# Altium footprint library CryptLib.PcbLib: 52 footprints (part 3 of 4)
Each footprint in its own frame and in the unit in brackets; x right, y up, seen from the top. Pads: shape width x height; smd on the part's side, far side on the other; paste and mask are expansions set on the pad; w line width, h text height; cw(c..) or ccw(c..) is an arc to the next point about the centre after c.
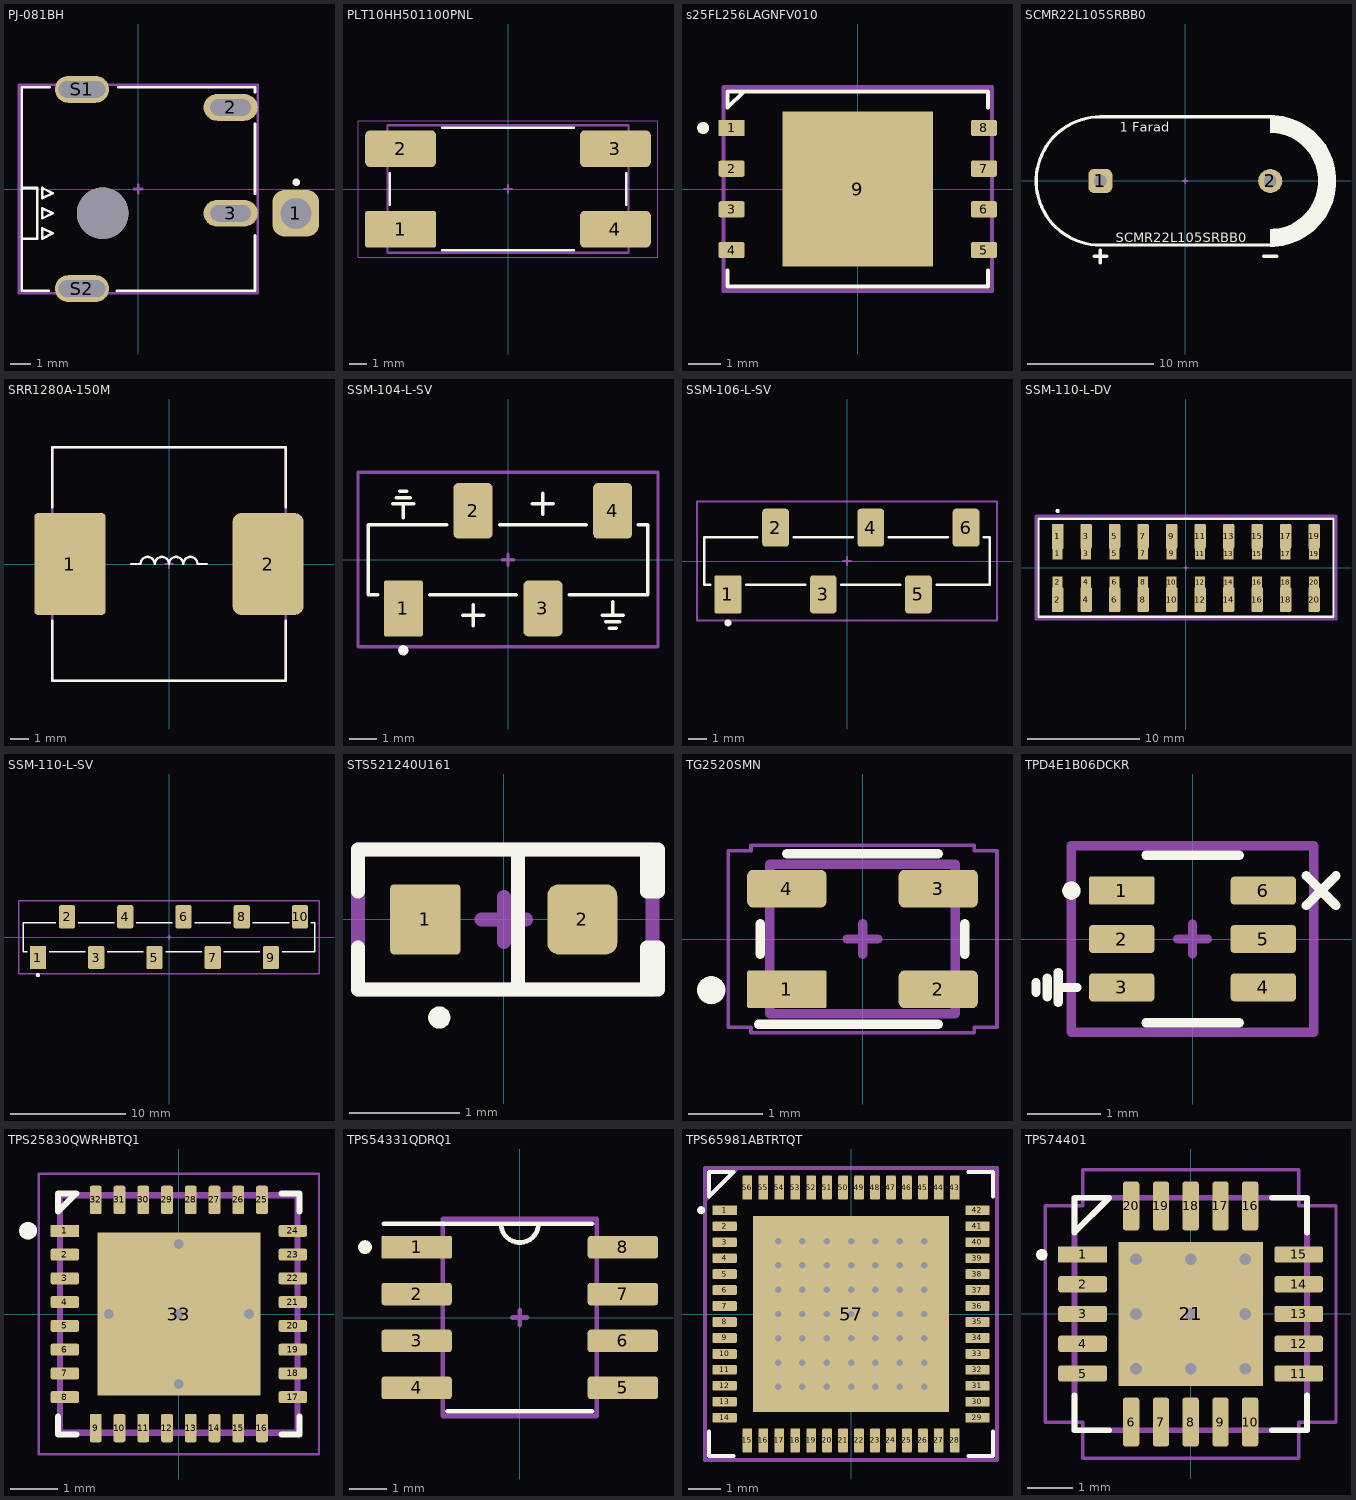
[diagram p2: the footprints below, top view; thin cyan lines are the x and y axes]

## PJ-081BH [mil]
pads (8):
  rrect50% 90x90 hole 60: 1(305,-47)
  oval 105x52 hole 32 slot 78.74 at 0 deg: 2(179,158) 3(179,-47)
  oval 105x52 hole 32 slot 90.55 at 0 deg: S1(-109,193) S2(-109,-193)
  round 100 hole 100 unplated: ""(-69,-47)
  round 7.5 on Mech8: ""(305,-47)
  round 15 on Top Overlay: ""(306,13)
Top Overlay:
  lines w5: -226,-96 -196,-96 -196,2 -226,2 ; -173,-197 -226,-197 -226,197 -172,197 ; -42,-197 226,-197 226,-90 ; -39,197 226,197 226,187 ; 226,-9 226,126 ; -186,-96 -166,-86 -186,-76 -186,-96 ; -186,-57 -166,-47 -186,-37 -186,-57 ; -186,-18 -166,-8 -186,2 -186,-18
Top Designator:
  text "'.Designator'" at -113.3,-8.33 h20
Top Assembly:
  lines w5: -8,0 8,0 ; 0,-8 0,8 ; -231,-202 -231,202 231,202 231,-202 -231,-202
3D body "CUI_DEVICES_PJ-081BH.step": height 288.96, standoff -92.93, extent -225.18,-196.85 326,196.85

## PLT10HH501100PNL [mil]
pads (5):
  rrect10% 156x80 smd: 1(-236.22,-88.58)
  rrect25% 156x80 smd: 2(-236.22,88.58) 3(236.22,88.58) 4(236.22,-88.58)
  round 7.5 on Mech8: ""(-236.22,-88.58)
Top Overlay:
  lines w5: -260,-35 -260,35 ; -145,-135 145,-135 ; -145,135 145,135 ; 260,-35 260,35
Top Designator:
  text "'.Designator'" at -113.3,-8.33 h20
Top Assembly:
  lines w5: -8,0 8,0 ; 0,-8 0,8 ; -265,-140 -265,140 265,140 265,-140 -265,-140
Top Courtyard (Mech10):
  lines w2: -330,-150 -330,150 330,150 330,-150 -330,-150
3D body "step_temp.STEP": height 370.08, standoff 0, extent -263.78,-129.92 263.78,129.92

## s25FL256LAGNFV010 [mil]
pads (11):
  rrect10% 32x20 smd: 1(-155,75)
  rrect25% 32x20 smd: 2(-155,25) 3(-155,-25) 4(-155,-75) 5(155,-75) 6(155,-25) 7(155,25) 8(155,75)
  rect 185x190 smd: 9(0,0)
  round 15 on Top Overlay: ""(-190,75)
  round 7.5 on Mech8: ""(-155,75)
Top Overlay:
  lines w5: -160,-100 -160,-120 160,-120 160,-100 ; -140,120 -160,100 -160,120 160,120 160,100
Top Designator:
  text "'.Designator'" at -113.3,-8.33 h20
Top Assembly:
  lines w5: -8,0 8,0 ; 0,-8 0,8 ; -165,-125 -165,125 165,125 165,-125 -165,-125
3D body "W25Q256JVEIQ TR--3DModel-STEP-1.STEP": height 32, standoff 0.5, extent -157.48,-118.12 157.48,118.1

## SCMR22L105SRBB0 [mil]
pads (3):
  rrect50% 75x75 hole 40: 1(-265,0)
  round 75 hole 40: 2(265,0)
  round 7.5 on Mech8: ""(-265,0)
Top Overlay:
  region: 265,205 265,150 274.81,149.68 294.26,147.12 313.22,142.04 331.34,134.53 348.34,124.72 363.9,112.78 377.78,98.9 389.72,83.34 399.53,66.34 407.04,48.22 412.12,29.26 414.68,9.81 415,0 414.68,-9.81 412.12,-29.26 407.04,-48.22 399.53,-66.34 389.72,-83.33 377.78,-98.9 363.9,-112.78 348.34,-124.72 331.34,-134.53 313.22,-142.04 294.26,-147.12 274.81,-149.68 265,-150 265,-205 278.44,-205.02 305.1,-201.54 331.07,-194.6 355.91,-184.33 379.2,-170.9 400.53,-154.54 419.54,-135.53 435.9,-114.2 449.33,-90.91 459.6,-66.07 466.54,-40.1 470.02,-13.44 470,0 469.98,13.43 466.45,40.06 459.47,66 449.18,90.82 435.74,114.08 419.38,135.38 400.38,154.38 379.07,170.74 355.82,184.18 331,194.47 305.06,201.45 278.43,204.98
  lines w10: -285,-235 -245,-235 ; -265.5,-200 265.5,-200 ; -265.5,200 265.5,200 ; -265,-255 -265,-215 ; -265,-200 cw(c-265,0) -265,200 ; 245,-235 285,-235 ; 265,-200 ccw(c265,0) 265,200
  text "SCMR22L105SRBB0" at -217.43,-191 h30
  text "1 Farad" at -204.44,154 h30
Top Designator:
  text "'.Designator'" at -113.3,-8.33 h20
Top Assembly:
  lines w5: -265.5,-200 cw(c-265.5,0) -265.5,200 ; -265,-200 265,-200 ; -265,200 265,200 ; -8,0 8,0 ; 0,-8 0,8 ; 265.5,-200 ccw(c265.5,0) 265.5,200
3D body "SUPERCAP.STEP": height 871.64, standoff -742.53, extent -423.23,-157 423.23,157.96

## SRR1280A-150M [mil]
pads (3):
  rrect10% 150x215 smd: 1(-209,0)
  rrect25% 150x215 smd: 2(209,0)
  round 7.5 on Mech8: ""(-209,0)
Top Overlay:
  lines w5: -246,-120 -246,-246 246,-246 246,-120 ; -246,120 -246,246 246,246 246,120 ; -80,0 -60,0 cw(c-45,0) -30,0 cw(c-15,0) 0,0 cw(c15,0) 30,0 cw(c45,0) 60,0 80,0
Top Designator:
  text "'.Designator'" at -113.3,-8.33 h20
Top Assembly:
  lines w5: -8,0 8,0 ; 0,-8 0,8 ; -246,-246 -246,246 246,246 246,-246 -246,-246
3D body "SRR1280A.stp": height 308.07, standoff 0, extent -246.06,-246.06 246.07,246.07

## SSM-104-L-SV [mil]
pads (6):
  rrect10% 56x80 smd: 1(-150,-70)
  rrect25% 56x80 smd: 2(-50,70) 3(50,-70) 4(150,70)
  round 15 on Top Overlay: ""(-150,-130)
  round 7.5 on Mech8: ""(-150,-70)
Top Overlay:
  lines w5: -187,-50 -200,-50 -200,50 -88,50 ; -165,80 -135,80 ; -160,89 -140,89 ; -155,98 -145,98 ; -150,60 -150,80 ; -112,-50 12,-50 ; -65,-80 -35,-80 ; -50,-95 -50,-65 ; -12,50 112,50 ; 35,80 65,80 ; 50,65 50,95 ; 88,-50 200,-50 200,50 187,50 ; 135,-80 165,-80 ; 140,-89 160,-89 ; 145,-98 155,-98 ; 150,-80 150,-60
Top Designator:
  text "'.Designator'" at -113.3,-8.33 h20
Top Assembly:
  lines w5: -8,0 8,0 ; 0,-8 0,8 ; -215,-125 -215,125 215,125 215,-125 -215,-125
3D body "SSM-104-L-SV.stp": height 295.5, standoff 0.5, extent -200,-90 200,90

## SSM-106-L-SV [mil]
pads (8):
  rrect10% 56x80 smd: 1(-250,-70)
  rrect25% 56x80 smd: 2(-150,70) 3(-50,-70) 4(50,70) 5(150,-70) 6(250,70)
  round 15 on Top Overlay: ""(-250,-130)
  round 7.5 on Mech8: ""(-250,-70)
Top Overlay:
  lines w5: -287,-50 -300,-50 -300,50 -188,50 ; -212,-50 -88,-50 ; -112,50 12,50 ; -12,-50 112,-50 ; 88,50 212,50 ; 188,-50 300,-50 300,50 287,50
Top Designator:
  text "'.Designator'" at -113.3,-8.33 h20
Top Assembly:
  lines w5: -8,0 8,0 ; 0,-8 0,8 ; -315,-125 315,-125 315,125 -315,125 -315,-125
3D body "SSM-106-L-SV.stp": height 295.5, standoff 0.5, extent -300,-90 300,90

## SSM-110-L-DV [mil]
pads (42):
  rect 35x40 smd: 1(-450,50) 2(-450,-50) 3(-350,50) 4(-350,-50) 5(-250,50) 6(-250,-50) 7(-150,50) 8(-150,-50) 9(-50,50) 10(-50,-50) 11(50,50) 12(50,-50) 13(150,50) 14(150,-50) 15(250,50) 16(250,-50) 17(350,50) 18(350,-50) 19(450,50) 20(450,-50)
  rrect10% 40x88 smd: 1(-450,111)
  rrect25% 40x88 smd: 2(-450,-111) 3(-350,111) 4(-350,-111) 5(-250,111) 6(-250,-111) 7(-150,111) 8(-150,-111) 9(-50,111) 10(-50,-111) 11(50,111) 12(50,-111) 13(150,111) 14(150,-111) 15(250,111) 16(250,-111) 17(350,111) 18(350,-111) 19(450,111) 20(450,-111)
  round 7.5 on Mech8: ""(-450,111)
  round 15 on Top Overlay: ""(-450,200)
Top Overlay:
  lines w7.87: -517,-171 -517,173 518,173 518,-171 -517,-171
Top Designator:
  text "'.Designator'" at -113.3,-8.33 h20
Top Assembly:
  lines w5: -8,0 8,0 ; 0,-8 0,8
  lines w10: -525.81,-179.81 -525.81,182 527,182 527,-179.81 -525.81,-179.81
3D body "SSM-110-L-DV.stp": height 292.5, standoff 0.5, extent -500.01,-138.5 499.99,138.5

## SSM-110-L-SV [mil]
pads (12):
  rrect10% 56x80 smd: 1(-450,-70)
  rrect25% 56x80 smd: 2(-350,70) 3(-250,-70) 4(-150,70) 5(-50,-70) 6(50,70) 7(150,-70) 8(250,70) 9(350,-70) 10(450,70)
  round 15 on Top Overlay: ""(-450,-130)
  round 7.5 on Mech8: ""(-450,-70)
Top Overlay:
  lines w5: -487,-50 -500,-50 -500,50 -388,50 ; -412,-50 -288,-50 ; -312,50 -188,50 ; -212,-50 -88,-50 ; -112,50 12,50 ; -12,-50 112,-50 ; 88,50 212,50 ; 188,-50 312,-50 ; 288,50 412,50 ; 388,-50 500,-50 500,50 487,50
Top Designator:
  text "'.Designator'" at -113.3,-8.33 h20
Top Assembly:
  lines w5: -8,0 8,0 ; 0,-8 0,8 ; -515,-125 -515,125 515,125 515,-125 -515,-125
3D body "SSM-110-L-SV.stp": height 295.5, standoff 0.5, extent -500.01,-90 499.99,90

## STS521240U161 [mil]
pads (4):
  rrect10% 25x25 smd: 1(-28,0)
  rrect33% 25x25 smd: 2(28,0)
  round 7.5 on Mech8: ""(-28,0)
  round 8 on Top Overlay: ""(-23,-35)
Top Overlay:
  lines w5: -52,-10 -52,-25 55,-25 55,-10 51,-10 51,-25 ; -52,10 -52,25 55,25 55,10 51,10 51,25 ; 5,-25 5,25
Top Designator:
  text "'.Designator'" at -113.3,-8.33 h20
Top Assembly:
  lines w5: -8,0 8,0 ; 0,-8 0,8 ; -52,-25 53,-25 53,25 -52,25 -52,-25
3D body "User Library-SOD523-2.step": height 26.13, standoff 0.5, extent -32.48,-15.75 32.48,15.73

## TG2520SMN [mil] "4-SMD 2.5x2.0"
height 32
pads (6):
  rrect10% 42x20 smd: 1(-40,-26.57)
  rrect33% 42x20 smd: 2(40,-26.57) 3(40,26.57) 4(-40,26.57)
  round 15 on Top Overlay: ""(-80,-27)
  round 7.5 on Mech8: ""(-40,-26.57)
Top Overlay:
  lines w5: -55,-45 40,-45 ; -54,-8 -54,8 ; -40,45 40,45 ; 54,-8 54,8
Top Designator:
  text "'.Designator'" at -113.3,-8.33 h20
Top Assembly:
  lines w5: -8,0 8,0 ; 0,-8 0,8 ; -49,-39.5 -49,39.5 49,39.5 49,-39.5 -49,-39.5
Top Courtyard (Mech10):
  lines w2: -71,-46.57 -59,-46.57 -59,-49.5 59,-49.5 59,-46.57 71,-46.57 71,46.57 59,46.57 59,49.5 -59,49.5 -59,46.57 -71,46.57 -71,-46.57
3D body "TG2520SMN.stp": height 32.39, standoff 0.5, extent -51.32,-42.39 51.05,40.29

## TPD4E1B06DCKR [mil]
pads (8):
  rrect10% 35x15 smd: 1(-38,26)
  rrect25% 35x15 smd: 2(-38,0) 3(-38,-26) 4(38,-26) 5(38,0) 6(38,26)
  round 10 on Top Overlay: ""(-65,26)
  round 7.5 on Mech8: ""(-38,26)
Top Overlay:
  lines w5: -84,-28.5 -84,-23.5 ; -78,-31 -78,-21 ; -72,-34 -72,-18 ; -72,-26 -62,-26 ; -25,-45 25,-45 ; -25,45 25,45 ; 61,18 77,34 ; 61,34 77,18
Top Designator:
  text "'.Designator'" at -113.3,-8.33 h20
Top Assembly:
  lines w5: -8,0 8,0 ; 0,-8 0,8
Mechanical 15:
  lines w5: -65,-50 -65,50 65,50 65,-50 -65,-50
3D body "TPD4E1B06DCKR.STEP": height 43.81, standoff 0.5, extent -41.34,-39.38 41.34,39.36

## TPS25830QWRHBTQ1 [mm]
pads (40):
  rrect10% 0.6x0.25 smd mask+0: 1(-2.4,1.75)
  rrect33% 0.6x0.25 smd mask+0: 2(-2.4,1.25) 3(-2.4,0.75) 4(-2.4,0.25) 5(-2.4,-0.25) 6(-2.4,-0.75) 7(-2.4,-1.25) 8(-2.4,-1.75) 17(2.4,-1.75) 18(2.4,-1.25) 19(2.4,-0.75) 20(2.4,-0.25) 21(2.4,0.25) 22(2.4,0.75) 23(2.4,1.25) 24(2.4,1.75)
  rrect33% 0.25x0.6 smd mask+0: 9(-1.75,-2.4) 10(-1.25,-2.4) 11(-0.75,-2.4) 12(-0.25,-2.4) 13(0.25,-2.4) 14(0.75,-2.4) 15(1.25,-2.4) 16(1.75,-2.4) 25(1.75,2.4) 26(1.25,2.4) 27(0.75,2.4) 28(0.25,2.4) 29(-0.25,2.4) 30(-0.75,2.4) 31(-1.25,2.4) 32(-1.75,2.4)
  rect 3.429x3.429 smd paste-253.975 mask+0: 33(0,0)
  round 0.381 on Top Overlay: ""(-3.175,1.753)
  round 0.191 on Mech8: ""(-2.4,1.75)
  round 0.406 hole 0.203 mask+0: ""(-1.475,0) ""(0,-1.475) ""(0,0) ""(0,1.475) ""(1.475,0)
Top Overlay:
  lines w0.127: -2.54,-2.159 -2.54,-2.54 -2.159,-2.54 ; 2.159,-2.54 2.54,-2.54 2.54,-2.159 ; 2.159,2.54 2.54,2.54 2.54,2.159 ; -2.54,2.159 -2.54,2.54 -2.159,2.54 -2.54,2.159
Top Paste:
  region: -0.1,0.1 -1.59,0.1 -1.59,1.59 -0.1,1.59
  region: 1.59,0.1 0.1,0.1 0.1,1.59 1.59,1.59
  region: -0.1,-1.59 -1.59,-1.59 -1.59,-0.1 -0.1,-0.1
  region: 1.59,-1.59 0.1,-1.59 0.1,-0.1 1.59,-0.1
Top Solder:
  drawing of 33 lines, arcs and shapes, not listed
Top Designator:
  text "'.Designator'" at -2.878,-0.212 h0.51
Top Assembly:
  lines w0.127: -2.5,2.199 -2.199,2.5 ; -0.203,0 0.203,0 ; 0,-0.203 0,0.203 ; -2.5,-2.5 2.5,-2.5 2.5,2.5 -2.5,2.5 -2.5,-2.5
Top Courtyard (Mech10):
  lines w0.051: -2.95,-2.95 2.95,-2.95 2.95,2.95 -2.95,2.95 -2.95,-2.95
3D body "TPS25830QWRHBTQ1.STEP": height 1.01, standoff 0.01, extent -2.5,-2.5 2.5,2.5

## TPS54331QDRQ1 [mil]
pads (10):
  rrect10% 75x24 smd: 1(-110,75)
  rrect25% 75x24 smd: 2(-110,25) 3(-110,-25) 4(-110,-75) 5(110,-75) 6(110,-25) 7(110,25) 8(110,75)
  round 15 on Top Overlay: ""(-165,75)
  round 7.5 on Mech8: ""(-110,75)
Top Overlay:
  lines w5: -145,100 77,100 ; -77,-100 77,-100 ; -20,100 ccw(c0,100) 20,100
Top Designator:
  text "'.Designator'" at -113.3,-8.33 h20
Top Assembly:
  lines w5: -8,0 8,0 ; 0,-8 0,8 ; -82,-105 82,-105 82,105 -82,105 -82,-105
3D body "TPS54331QDRQ1.STEP": height 69.4, standoff 0.5, extent -118.11,-96.46 118.11,96.45

## TPS65981ABTRTQT [mil]
pads (108):
  rrect10% 30x12 smd: 1(-155.94,127.95)
  rrect25% 30x12 smd: 2(-155.94,108.27) 3(-155.94,88.58) 4(-155.94,68.9) 5(-155.94,49.21) 6(-155.94,29.53) 7(-155.94,9.84) 8(-155.94,-9.84) 9(-155.94,-29.53) 10(-155.94,-49.21) 11(-155.94,-68.9) 12(-155.94,-88.58) 13(-155.94,-108.27) 14(-155.94,-127.95) 29(155.94,-127.95) 30(155.94,-108.27) 31(155.94,-88.58) 32(155.94,-68.9) 33(155.94,-49.21) 34(155.94,-29.53) 35(155.94,-9.84) 36(155.94,9.84) 37(155.94,29.53) 38(155.94,49.21) 39(155.94,68.9) 40(155.94,88.58) 41(155.94,108.27) 42(155.94,127.95)
  rrect25% 12x30 smd: 15(-127.98,-155.94) 16(-108.3,-155.94) 17(-88.61,-155.94) 18(-68.92,-155.94) 19(-49.23,-155.94) 20(-29.54,-155.94) 21(-9.85,-155.94) 22(9.85,-155.94) 23(29.54,-155.94) 24(49.23,-155.94) 25(68.92,-155.94) 26(88.61,-155.94) 27(108.3,-155.94) 28(127.98,-155.94) 43(127.98,155.94) 44(108.3,155.94) 45(88.61,155.94) 46(68.92,155.94) 47(49.23,155.94) 48(29.54,155.94) 49(9.85,155.94) 50(-9.85,155.94) 51(-29.54,155.94) 52(-49.23,155.94) 53(-68.92,155.94) 54(-88.61,155.94) 55(-108.3,155.94) 56(-127.98,155.94)
  rect 242x242 smd: 57(0,0)
  round 10 on Top Overlay: ""(-185,128)
  round 7.5 on Mech8: ""(-155.94,127.95)
  round 16 hole 8 mask+0: ""(-90,-90) ""(-90,-60) ""(-90,-30) ""(-90,0) ""(-90,30) ""(-90,60) ""(-90,90) ""(-60,-90) ""(-60,-60) ""(-60,-30) ""(-60,0) ""(-60,30) ""(-60,60) ""(-60,90) ""(-30,-90) ""(-30,-60) ""(-30,-30) ""(-30,0) ""(-30,30) ""(-30,60) ""(-30,90) ""(0,-90) ""(0,-60) ""(0,-30) ""(0,0) ""(0,30) ""(0,60) ""(0,90) ""(30,-90) ""(30,-60) ""(30,-30) ""(30,0) ""(30,30) ""(30,60) ""(30,90) ""(60,-90) ""(60,-60) ""(60,-30) ""(60,0) ""(60,30) ""(60,60) ""(60,90) ""(90,-90) ""(90,-60) ""(90,-30) ""(90,0) ""(90,30) ""(90,60) ""(90,90)
Top Overlay:
  lines w5: -175,-145 -175,-175 -145,-175 ; 145,-175 175,-175 175,-145 ; 145,175 175,175 175,145 ; -175,145 -175,175 -145,175 -175,145
Top Designator:
  text "'.Designator'" at -113.3,-8.33 h20
Top Assembly:
  lines w5: -180,140 -140,180 ; -8,0 8,0 ; 0,-8 0,8 ; -180,-180 -180,180 180,180 180,-180 -180,-180
3D body "RTQ0056H.stp": height 39.37, standoff 0, extent -157.48,-157.48 157.49,157.49

## TPS74401 [mil] "LDO Regulator"
height 40
pads (23):
  rrect10% 42x14 smd: 1(-92.91,51.18)
  rrect33% 42x14 smd: 2(-92.91,25.59) 3(-92.91,0) 4(-92.91,-25.59) 5(-92.91,-51.18) 11(92.91,-51.18) 12(92.91,-25.59) 13(92.91,0) 14(92.91,25.59) 15(92.91,51.18)
  rrect33% 14x42 smd: 6(-51.18,-92.91) 7(-25.59,-92.91) 8(0,-92.91) 9(25.59,-92.91) 10(51.18,-92.91) 16(51.18,92.91) 17(25.59,92.91) 18(0,92.91) 19(-25.59,92.91) 20(-51.18,92.91)
  rect 124.02x124.02 smd paste-118.11: 21(0,0)
  round 10 on Top Overlay: ""(-128,51)
  round 7.5 on Mech8: ""(-92.91,51.18)
via 47.05,-47.05 diameter 20 hole 10
via 47.05,47.05 diameter 20 hole 10
via -47.05,47.05 diameter 20 hole 10
via -47.05,-47.05 diameter 20 hole 10
via 0,-47 diameter 20 hole 10
via 0,47 diameter 20 hole 10
via 47,0 diameter 20 hole 10
via -47,0 diameter 20 hole 10
via 0,0 diameter 20 hole 10
Top Overlay:
  lines w5: -100,-70 -100,-100 -70,-100 ; 70,-100 100,-100 100,-70 ; 70,100 100,100 100,70 ; -100,70 -100,100 -70,100 -100,70
Top Paste:
  region: -7.68,-47.05 -47.05,-47.05 -47.05,-7.68 -7.68,-7.68
  region: -7.68,7.68 -47.05,7.68 -47.05,47.05 -7.68,47.05
  region: 47.05,7.68 7.68,7.68 7.68,47.05 47.05,47.05
  region: 47.05,-47.05 7.68,-47.05 7.68,-7.68 47.05,-7.68
Top Designator:
  text "'.Designator'" at -113.3,-8.33 h20
Top Assembly:
  lines w5: -100,70 -70,100 ; -8,0 8,0 ; 0,-8 0,8 ; -100,-100 100,-100 100,100 -100,100 -100,-100
Top Courtyard (Mech10):
  lines w3: 125,91.91 125,-92.91 92.91,-92.91 92.91,-124 -92.91,-124 -92.91,-92.91 -125,-92.91 -125,92.91 -92.91,92.91 -92.91,124 92.91,124 92.91,92.91 125,92.91
3D body "step_temp.STEP": height 39.37, standoff 0, extent -98.43,-98.43 98.43,98.43